# Altium schematic symbol library jlcpcb_2025_04_capacitors_extended_0402.schlib: 3594 symbols (part 9 of 20)
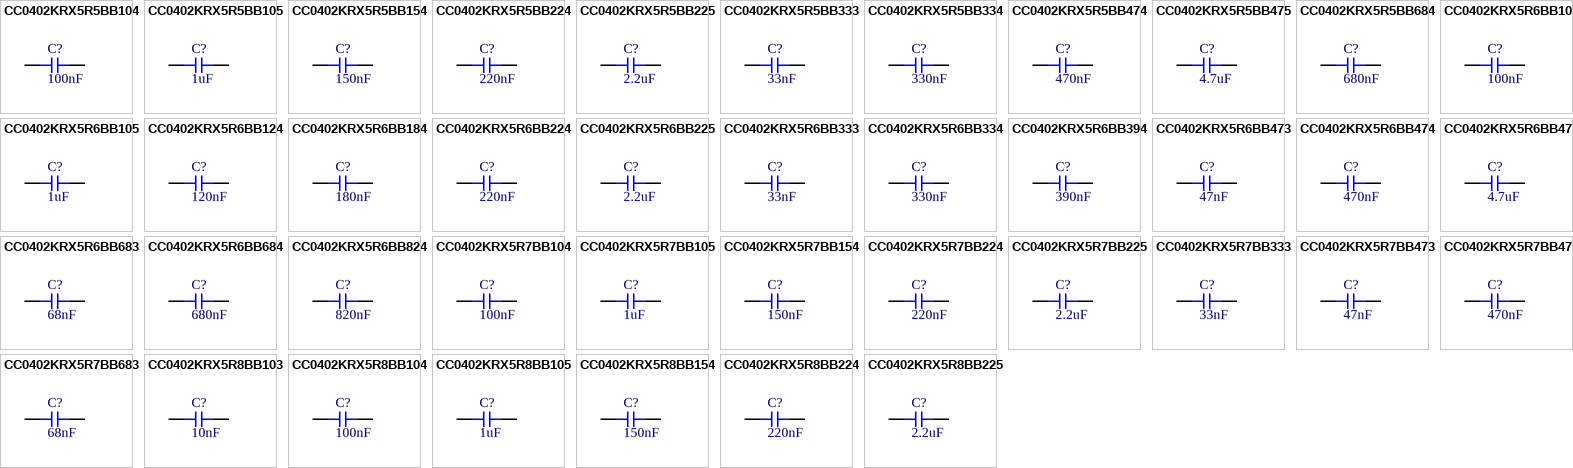
[diagram p97: symbols CC0402KRX5R5BB104 to CC0402KRX5R8BB225]

## CC0402KRX5R6BB105
designator C?  Capacitance: 1uF  (hidden comment: *)
Capacitor, Ceramic (MLCC), 1uF, ±10%, 10V, X5R, ±10%, SMD 0402; Manufacturer: YAGEO; Manufacturer Part Number: CC0402KRX5R6BB105; Package Size: 0402; JLCPCB Basic Part: No; JLCPCB Part Number: C106254; Supplier 1: LCSC; Category: Capacitors - MLCC; Supplier Part Number 1: C106254; Tolerance: ±10%; Voltage Rating: 10V; Temperature Coefficient: X5R; RoHS: Yes; ComponentLink1Description: Datasheet; ComponentLink1URL: https://wmsc.lcsc.com/wmsc/upload/file/pdf/v2/lcsc/2407081117_YAGEO-CC0402KRX5R6BB105_C106254.pdf; ComponentLink2Description: JLCPCB Part URL; ComponentLink2URL: https://jlcpcb.com/partdetail/C106254; ComponentLink3Description: LCSC Part URL; ComponentLink3URL: https://lcsc.com/product-detail/Multilayer-Ceramic-Capacitors-MLCC---SMD-SMT_YAGEO-YAGEO-CC0402KRX5R6BB105_C106254.html
footprint CAP-0402 (0402 (1005M) Capacitor)
pins: 1, 2

## CC0402KRX5R6BB124
designator C?  Capacitance: 120nF  (hidden comment: *)
Capacitor, Ceramic (MLCC), 120nF, ±10%, 10V, X5R, ±10%, SMD 0402; Manufacturer: YAGEO; Manufacturer Part Number: CC0402KRX5R6BB124; Package Size: 0402; JLCPCB Basic Part: No; JLCPCB Part Number: C576722; Supplier 1: LCSC; Category: Capacitors - MLCC; Supplier Part Number 1: C576722; Tolerance: ±10%; Voltage Rating: 10V; Temperature Coefficient: X5R; RoHS: Yes; ComponentLink1Description: Datasheet; ComponentLink1URL: https://wmsc.lcsc.com/wmsc/upload/file/pdf/v2/lcsc/2407081117_YAGEO-CC0402KRX5R6BB124_C576722.pdf; ComponentLink2Description: JLCPCB Part URL; ComponentLink2URL: https://jlcpcb.com/partdetail/C576722; ComponentLink3Description: LCSC Part URL; ComponentLink3URL: https://lcsc.com/product-detail/Multilayer-Ceramic-Capacitors-MLCC---SMD-SMT_YAGEO-YAGEO-CC0402KRX5R6BB124_C576722.html
footprint CAP-0402 (0402 (1005M) Capacitor)
pins: 1, 2

## CC0402KRX5R6BB184
designator C?  Capacitance: 180nF  (hidden comment: *)
Capacitor, Ceramic (MLCC), 180nF, ±10%, 10V, X5R, ±10%, SMD 0402; Manufacturer: YAGEO; Manufacturer Part Number: CC0402KRX5R6BB184; Package Size: 0402; JLCPCB Basic Part: No; JLCPCB Part Number: C309457; Supplier 1: LCSC; Category: Capacitors - MLCC; Supplier Part Number 1: C309457; Tolerance: ±10%; Voltage Rating: 10V; Temperature Coefficient: X5R; RoHS: Yes; ComponentLink1Description: Datasheet; ComponentLink1URL: https://wmsc.lcsc.com/wmsc/upload/file/pdf/v2/lcsc/2407081117_YAGEO-CC0402KRX5R6BB184_C309457.pdf; ComponentLink2Description: JLCPCB Part URL; ComponentLink2URL: https://jlcpcb.com/partdetail/C309457; ComponentLink3Description: LCSC Part URL; ComponentLink3URL: https://lcsc.com/product-detail/Multilayer-Ceramic-Capacitors-MLCC---SMD-SMT_YAGEO-YAGEO-CC0402KRX5R6BB184_C309457.html
footprint CAP-0402 (0402 (1005M) Capacitor)
pins: 1, 2

## CC0402KRX5R6BB224
designator C?  Capacitance: 220nF  (hidden comment: *)
Capacitor, Ceramic (MLCC), 220nF, ±10%, 10V, X5R, ±10%, SMD 0402; Manufacturer: YAGEO; Manufacturer Part Number: CC0402KRX5R6BB224; Package Size: 0402; JLCPCB Basic Part: No; JLCPCB Part Number: C106257; Supplier 1: LCSC; Category: Capacitors - MLCC; Supplier Part Number 1: C106257; Tolerance: ±10%; Voltage Rating: 10V; Temperature Coefficient: X5R; RoHS: Yes; ComponentLink1Description: Datasheet; ComponentLink1URL: https://wmsc.lcsc.com/wmsc/upload/file/pdf/v2/lcsc/2407081117_YAGEO-CC0402KRX5R6BB224_C106257.pdf; ComponentLink2Description: JLCPCB Part URL; ComponentLink2URL: https://jlcpcb.com/partdetail/C106257; ComponentLink3Description: LCSC Part URL; ComponentLink3URL: https://lcsc.com/product-detail/Multilayer-Ceramic-Capacitors-MLCC---SMD-SMT_YAGEO-YAGEO-CC0402KRX5R6BB224_C106257.html
footprint CAP-0402 (0402 (1005M) Capacitor)
pins: 1, 2

## CC0402KRX5R6BB225
designator C?  Capacitance: 2.2uF  (hidden comment: *)
Capacitor, Ceramic (MLCC), 2.2uF, ±10%, 10V, X5R, ±10%, SMD 0402; Manufacturer: YAGEO; Manufacturer Part Number: CC0402KRX5R6BB225; Package Size: 0402; JLCPCB Basic Part: No; JLCPCB Part Number: C326606; Supplier 1: LCSC; Category: Capacitors - MLCC; Supplier Part Number 1: C326606; Tolerance: ±10%; Voltage Rating: 10V; Temperature Coefficient: X5R; RoHS: Yes; ComponentLink1Description: Datasheet; ComponentLink1URL: https://wmsc.lcsc.com/wmsc/upload/file/pdf/v2/lcsc/2407081117_YAGEO-CC0402KRX5R6BB225_C326606.pdf; ComponentLink2Description: JLCPCB Part URL; ComponentLink2URL: https://jlcpcb.com/partdetail/C326606; ComponentLink3Description: LCSC Part URL; ComponentLink3URL: https://lcsc.com/product-detail/Multilayer-Ceramic-Capacitors-MLCC---SMD-SMT_YAGEO-YAGEO-CC0402KRX5R6BB225_C326606.html
footprint CAP-0402 (0402 (1005M) Capacitor)
pins: 1, 2

## CC0402KRX5R6BB333
designator C?  Capacitance: 33nF  (hidden comment: *)
Capacitor, Ceramic (MLCC), 33nF, ±10%, 10V, X5R, ±10%, SMD 0402; Manufacturer: YAGEO; Manufacturer Part Number: CC0402KRX5R6BB333; Package Size: 0402; JLCPCB Basic Part: No; JLCPCB Part Number: C541396; Supplier 1: LCSC; Category: Capacitors - MLCC; Supplier Part Number 1: C541396; Tolerance: ±10%; Voltage Rating: 10V; Temperature Coefficient: X5R; RoHS: Yes; ComponentLink1Description: Datasheet; ComponentLink1URL: https://wmsc.lcsc.com/wmsc/upload/file/pdf/v2/lcsc/2407081117_YAGEO-CC0402KRX5R6BB333_C541396.pdf; ComponentLink2Description: JLCPCB Part URL; ComponentLink2URL: https://jlcpcb.com/partdetail/C541396; ComponentLink3Description: LCSC Part URL; ComponentLink3URL: https://lcsc.com/product-detail/Multilayer-Ceramic-Capacitors-MLCC---SMD-SMT_YAGEO-YAGEO-CC0402KRX5R6BB333_C541396.html
footprint CAP-0402 (0402 (1005M) Capacitor)
pins: 1, 2

## CC0402KRX5R6BB334
designator C?  Capacitance: 330nF  (hidden comment: *)
Capacitor, Ceramic (MLCC), 330nF, ±10%, 10V, X5R, ±10%, SMD 0402; Manufacturer: YAGEO; Manufacturer Part Number: CC0402KRX5R6BB334; Package Size: 0402; JLCPCB Basic Part: No; JLCPCB Part Number: C107013; Supplier 1: LCSC; Category: Capacitors - MLCC; Supplier Part Number 1: C107013; Tolerance: ±10%; Voltage Rating: 10V; Temperature Coefficient: X5R; RoHS: Yes; ComponentLink1Description: Datasheet; ComponentLink1URL: https://wmsc.lcsc.com/wmsc/upload/file/pdf/v2/lcsc/2407081117_YAGEO-CC0402KRX5R6BB334_C107013.pdf; ComponentLink2Description: JLCPCB Part URL; ComponentLink2URL: https://jlcpcb.com/partdetail/C107013; ComponentLink3Description: LCSC Part URL; ComponentLink3URL: https://lcsc.com/product-detail/Multilayer-Ceramic-Capacitors-MLCC---SMD-SMT_YAGEO-YAGEO-CC0402KRX5R6BB334_C107013.html
footprint CAP-0402 (0402 (1005M) Capacitor)
pins: 1, 2

## CC0402KRX5R6BB394
designator C?  Capacitance: 390nF  (hidden comment: *)
Capacitor, Ceramic (MLCC), 390nF, ±10%, 10V, X5R, ±10%, SMD 0402; Manufacturer: YAGEO; Manufacturer Part Number: CC0402KRX5R6BB394; Package Size: 0402; JLCPCB Basic Part: No; JLCPCB Part Number: C7500384; Supplier 1: LCSC; Category: Capacitors - MLCC; Supplier Part Number 1: C7500384; Tolerance: ±10%; Voltage Rating: 10V; Temperature Coefficient: X5R; RoHS: Yes; ComponentLink1Description: Datasheet; ComponentLink1URL: https://wmsc.lcsc.com/wmsc/upload/file/pdf/v2/lcsc/2407081117_YAGEO-CC0402KRX5R6BB394_C7500384.pdf; ComponentLink2Description: JLCPCB Part URL; ComponentLink2URL: https://jlcpcb.com/partdetail/C7500384; ComponentLink3Description: LCSC Part URL; ComponentLink3URL: https://lcsc.com/product-detail/Multilayer-Ceramic-Capacitors-MLCC---SMD-SMT_YAGEO-YAGEO-CC0402KRX5R6BB394_C7500384.html
footprint CAP-0402 (0402 (1005M) Capacitor)
pins: 1, 2

## CC0402KRX5R6BB473
designator C?  Capacitance: 47nF  (hidden comment: *)
Capacitor, Ceramic (MLCC), 47nF, ±10%, 10V, X5R, ±10%, SMD 0402; Manufacturer: YAGEO; Manufacturer Part Number: CC0402KRX5R6BB473; Package Size: 0402; JLCPCB Basic Part: No; JLCPCB Part Number: C541397; Supplier 1: LCSC; Category: Capacitors - MLCC; Supplier Part Number 1: C541397; Tolerance: ±10%; Voltage Rating: 10V; Temperature Coefficient: X5R; RoHS: Yes; ComponentLink1Description: Datasheet; ComponentLink1URL: https://wmsc.lcsc.com/wmsc/upload/file/pdf/v2/lcsc/2407081117_YAGEO-CC0402KRX5R6BB473_C541397.pdf; ComponentLink2Description: JLCPCB Part URL; ComponentLink2URL: https://jlcpcb.com/partdetail/C541397; ComponentLink3Description: LCSC Part URL; ComponentLink3URL: https://lcsc.com/product-detail/Multilayer-Ceramic-Capacitors-MLCC---SMD-SMT_YAGEO-YAGEO-CC0402KRX5R6BB473_C541397.html
footprint CAP-0402 (0402 (1005M) Capacitor)
pins: 1, 2

## CC0402KRX5R6BB474
designator C?  Capacitance: 470nF  (hidden comment: *)
Capacitor, Ceramic (MLCC), 470nF, ±10%, 10V, X5R, ±10%, SMD 0402; Manufacturer: YAGEO; Manufacturer Part Number: CC0402KRX5R6BB474; Package Size: 0402; JLCPCB Basic Part: No; JLCPCB Part Number: C106255; Supplier 1: LCSC; Category: Capacitors - MLCC; Supplier Part Number 1: C106255; Tolerance: ±10%; Voltage Rating: 10V; Temperature Coefficient: X5R; RoHS: Yes; ComponentLink1Description: Datasheet; ComponentLink1URL: https://wmsc.lcsc.com/wmsc/upload/file/pdf/v2/lcsc/2407081117_YAGEO-CC0402KRX5R6BB474_C106255.pdf; ComponentLink2Description: JLCPCB Part URL; ComponentLink2URL: https://jlcpcb.com/partdetail/C106255; ComponentLink3Description: LCSC Part URL; ComponentLink3URL: https://lcsc.com/product-detail/Multilayer-Ceramic-Capacitors-MLCC---SMD-SMT_YAGEO-YAGEO-CC0402KRX5R6BB474_C106255.html
footprint CAP-0402 (0402 (1005M) Capacitor)
pins: 1, 2

## CC0402KRX5R6BB475
designator C?  Capacitance: 4.7uF  (hidden comment: *)
Capacitor, Ceramic (MLCC), 4.7uF, ±10%, 10V, X5R, ±10%, SMD 0402; Manufacturer: YAGEO; Manufacturer Part Number: CC0402KRX5R6BB475; Package Size: 0402; JLCPCB Basic Part: No; JLCPCB Part Number: C326586; Supplier 1: LCSC; Category: Capacitors - MLCC; Supplier Part Number 1: C326586; Tolerance: ±10%; Voltage Rating: 10V; Temperature Coefficient: X5R; RoHS: Yes; ComponentLink1Description: Datasheet; ComponentLink1URL: https://wmsc.lcsc.com/wmsc/upload/file/pdf/v2/lcsc/2407081117_YAGEO-CC0402KRX5R6BB475_C326586.pdf; ComponentLink2Description: JLCPCB Part URL; ComponentLink2URL: https://jlcpcb.com/partdetail/C326586; ComponentLink3Description: LCSC Part URL; ComponentLink3URL: https://lcsc.com/product-detail/Multilayer-Ceramic-Capacitors-MLCC---SMD-SMT_YAGEO-YAGEO-CC0402KRX5R6BB475_C326586.html
footprint CAP-0402 (0402 (1005M) Capacitor)
pins: 1, 2

## CC0402KRX5R6BB683
designator C?  Capacitance: 68nF  (hidden comment: *)
Capacitor, Ceramic (MLCC), 68nF, ±10%, 10V, X5R, ±10%, SMD 0402; Manufacturer: YAGEO; Manufacturer Part Number: CC0402KRX5R6BB683; Package Size: 0402; JLCPCB Basic Part: No; JLCPCB Part Number: C541398; Supplier 1: LCSC; Category: Capacitors - MLCC; Supplier Part Number 1: C541398; Tolerance: ±10%; Voltage Rating: 10V; Temperature Coefficient: X5R; RoHS: Yes; ComponentLink1Description: Datasheet; ComponentLink1URL: https://wmsc.lcsc.com/wmsc/upload/file/pdf/v2/lcsc/2407081117_YAGEO-CC0402KRX5R6BB683_C541398.pdf; ComponentLink2Description: JLCPCB Part URL; ComponentLink2URL: https://jlcpcb.com/partdetail/C541398; ComponentLink3Description: LCSC Part URL; ComponentLink3URL: https://lcsc.com/product-detail/Multilayer-Ceramic-Capacitors-MLCC---SMD-SMT_YAGEO-YAGEO-CC0402KRX5R6BB683_C541398.html
footprint CAP-0402 (0402 (1005M) Capacitor)
pins: 1, 2

## CC0402KRX5R6BB684
designator C?  Capacitance: 680nF  (hidden comment: *)
Capacitor, Ceramic (MLCC), 680nF, ±10%, 10V, X5R, ±10%, SMD 0402; Manufacturer: YAGEO; Manufacturer Part Number: CC0402KRX5R6BB684; Package Size: 0402; JLCPCB Basic Part: No; JLCPCB Part Number: C113784; Supplier 1: LCSC; Category: Capacitors - MLCC; Supplier Part Number 1: C113784; Tolerance: ±10%; Voltage Rating: 10V; Temperature Coefficient: X5R; RoHS: Yes; ComponentLink1Description: Datasheet; ComponentLink1URL: https://wmsc.lcsc.com/wmsc/upload/file/pdf/v2/lcsc/2407081117_YAGEO-CC0402KRX5R6BB684_C113784.pdf; ComponentLink2Description: JLCPCB Part URL; ComponentLink2URL: https://jlcpcb.com/partdetail/C113784; ComponentLink3Description: LCSC Part URL; ComponentLink3URL: https://lcsc.com/product-detail/Multilayer-Ceramic-Capacitors-MLCC---SMD-SMT_YAGEO-YAGEO-CC0402KRX5R6BB684_C113784.html
footprint CAP-0402 (0402 (1005M) Capacitor)
pins: 1, 2

## CC0402KRX5R6BB824
designator C?  Capacitance: 820nF  (hidden comment: *)
Capacitor, Ceramic (MLCC), 820nF, ±10%, 10V, X5R, ±10%, SMD 0402; Manufacturer: YAGEO; Manufacturer Part Number: CC0402KRX5R6BB824; Package Size: 0402; JLCPCB Basic Part: No; JLCPCB Part Number: C576724; Supplier 1: LCSC; Category: Capacitors - MLCC; Supplier Part Number 1: C576724; Tolerance: ±10%; Voltage Rating: 10V; Temperature Coefficient: X5R; RoHS: Yes; ComponentLink1Description: Datasheet; ComponentLink1URL: https://wmsc.lcsc.com/wmsc/upload/file/pdf/v2/lcsc/2407081117_YAGEO-CC0402KRX5R6BB824_C576724.pdf; ComponentLink2Description: JLCPCB Part URL; ComponentLink2URL: https://jlcpcb.com/partdetail/C576724; ComponentLink3Description: LCSC Part URL; ComponentLink3URL: https://lcsc.com/product-detail/Multilayer-Ceramic-Capacitors-MLCC---SMD-SMT_YAGEO-YAGEO-CC0402KRX5R6BB824_C576724.html
footprint CAP-0402 (0402 (1005M) Capacitor)
pins: 1, 2

## CC0402KRX5R7BB104
designator C?  Capacitance: 100nF  (hidden comment: *)
Capacitor, Ceramic (MLCC), 100nF, ±10%, 16V, X5R, ±10%, SMD 0402; Manufacturer: YAGEO; Manufacturer Part Number: CC0402KRX5R7BB104; Package Size: 0402; JLCPCB Basic Part: No; JLCPCB Part Number: C106204; Supplier 1: LCSC; Category: Capacitors - MLCC; Supplier Part Number 1: C106204; Tolerance: ±10%; Voltage Rating: 16V; Temperature Coefficient: X5R; RoHS: Yes; ComponentLink1Description: Datasheet; ComponentLink1URL: https://wmsc.lcsc.com/wmsc/upload/file/pdf/v2/lcsc/2407081117_YAGEO-CC0402KRX5R7BB104_C106204.pdf; ComponentLink2Description: JLCPCB Part URL; ComponentLink2URL: https://jlcpcb.com/partdetail/C106204; ComponentLink3Description: LCSC Part URL; ComponentLink3URL: https://lcsc.com/product-detail/Multilayer-Ceramic-Capacitors-MLCC---SMD-SMT_YAGEO-YAGEO-CC0402KRX5R7BB104_C106204.html
footprint CAP-0402 (0402 (1005M) Capacitor)
pins: 1, 2

## CC0402KRX5R7BB105
designator C?  Capacitance: 1uF  (hidden comment: *)
Capacitor, Ceramic (MLCC), 1uF, ±10%, 16V, X5R, ±10%, SMD 0402; Manufacturer: YAGEO; Manufacturer Part Number: CC0402KRX5R7BB105; Package Size: 0402; JLCPCB Basic Part: No; JLCPCB Part Number: C325464; Supplier 1: LCSC; Category: Capacitors - MLCC; Supplier Part Number 1: C325464; Tolerance: ±10%; Voltage Rating: 16V; Temperature Coefficient: X5R; RoHS: Yes; ComponentLink1Description: Datasheet; ComponentLink1URL: https://wmsc.lcsc.com/wmsc/upload/file/pdf/v2/lcsc/2407081117_YAGEO-CC0402KRX5R7BB105_C325464.pdf; ComponentLink2Description: JLCPCB Part URL; ComponentLink2URL: https://jlcpcb.com/partdetail/C325464; ComponentLink3Description: LCSC Part URL; ComponentLink3URL: https://lcsc.com/product-detail/Multilayer-Ceramic-Capacitors-MLCC---SMD-SMT_YAGEO-YAGEO-CC0402KRX5R7BB105_C325464.html
footprint CAP-0402 (0402 (1005M) Capacitor)
pins: 1, 2

## CC0402KRX5R7BB154
designator C?  Capacitance: 150nF  (hidden comment: *)
Capacitor, Ceramic (MLCC), 150nF, ±10%, 16V, X5R, ±10%, SMD 0402; Manufacturer: YAGEO; Manufacturer Part Number: CC0402KRX5R7BB154; Package Size: 0402; JLCPCB Basic Part: No; JLCPCB Part Number: C576725; Supplier 1: LCSC; Category: Capacitors - MLCC; Supplier Part Number 1: C576725; Tolerance: ±10%; Voltage Rating: 16V; Temperature Coefficient: X5R; RoHS: Yes; ComponentLink1Description: Datasheet; ComponentLink1URL: https://wmsc.lcsc.com/wmsc/upload/file/pdf/v2/lcsc/2407081117_YAGEO-CC0402KRX5R7BB154_C576725.pdf; ComponentLink2Description: JLCPCB Part URL; ComponentLink2URL: https://jlcpcb.com/partdetail/C576725; ComponentLink3Description: LCSC Part URL; ComponentLink3URL: https://lcsc.com/product-detail/Multilayer-Ceramic-Capacitors-MLCC---SMD-SMT_YAGEO-YAGEO-CC0402KRX5R7BB154_C576725.html
footprint CAP-0402 (0402 (1005M) Capacitor)
pins: 1, 2

## CC0402KRX5R7BB224
designator C?  Capacitance: 220nF  (hidden comment: *)
Capacitor, Ceramic (MLCC), 220nF, ±10%, 16V, X5R, ±10%, SMD 0402; Manufacturer: YAGEO; Manufacturer Part Number: CC0402KRX5R7BB224; Package Size: 0402; JLCPCB Basic Part: No; JLCPCB Part Number: C106258; Supplier 1: LCSC; Category: Capacitors - MLCC; Supplier Part Number 1: C106258; Tolerance: ±10%; Voltage Rating: 16V; Temperature Coefficient: X5R; RoHS: Yes; ComponentLink1Description: Datasheet; ComponentLink1URL: https://wmsc.lcsc.com/wmsc/upload/file/pdf/v2/lcsc/2407081117_YAGEO-CC0402KRX5R7BB224_C106258.pdf; ComponentLink2Description: JLCPCB Part URL; ComponentLink2URL: https://jlcpcb.com/partdetail/C106258; ComponentLink3Description: LCSC Part URL; ComponentLink3URL: https://lcsc.com/product-detail/Multilayer-Ceramic-Capacitors-MLCC---SMD-SMT_YAGEO-YAGEO-CC0402KRX5R7BB224_C106258.html
footprint CAP-0402 (0402 (1005M) Capacitor)
pins: 1, 2

## CC0402KRX5R7BB225
designator C?  Capacitance: 2.2uF  (hidden comment: *)
Capacitor, Ceramic (MLCC), 2.2uF, ±10%, 16V, X5R, ±10%, SMD 0402; Manufacturer: YAGEO; Manufacturer Part Number: CC0402KRX5R7BB225; Package Size: 0402; JLCPCB Basic Part: No; JLCPCB Part Number: C326556; Supplier 1: LCSC; Category: Capacitors - MLCC; Supplier Part Number 1: C326556; Tolerance: ±10%; Voltage Rating: 16V; Temperature Coefficient: X5R; RoHS: Yes; ComponentLink1Description: Datasheet; ComponentLink1URL: https://wmsc.lcsc.com/wmsc/upload/file/pdf/v2/lcsc/2407081039_YAGEO-CC0402KRX5R7BB225_C326556.pdf; ComponentLink2Description: JLCPCB Part URL; ComponentLink2URL: https://jlcpcb.com/partdetail/C326556; ComponentLink3Description: LCSC Part URL; ComponentLink3URL: https://lcsc.com/product-detail/Multilayer-Ceramic-Capacitors-MLCC---SMD-SMT_YAGEO-YAGEO-CC0402KRX5R7BB225_C326556.html
footprint CAP-0402 (0402 (1005M) Capacitor)
pins: 1, 2

## CC0402KRX5R7BB333
designator C?  Capacitance: 33nF  (hidden comment: *)
Capacitor, Ceramic (MLCC), 33nF, ±10%, 16V, X5R, ±10%, SMD 0402; Manufacturer: YAGEO; Manufacturer Part Number: CC0402KRX5R7BB333; Package Size: 0402; JLCPCB Basic Part: No; JLCPCB Part Number: C505503; Supplier 1: LCSC; Category: Capacitors - MLCC; Supplier Part Number 1: C505503; Tolerance: ±10%; Voltage Rating: 16V; Temperature Coefficient: X5R; RoHS: Yes; ComponentLink1Description: Datasheet; ComponentLink1URL: https://wmsc.lcsc.com/wmsc/upload/file/pdf/v2/lcsc/2407081117_YAGEO-CC0402KRX5R7BB333_C505503.pdf; ComponentLink2Description: JLCPCB Part URL; ComponentLink2URL: https://jlcpcb.com/partdetail/C505503; ComponentLink3Description: LCSC Part URL; ComponentLink3URL: https://lcsc.com/product-detail/Multilayer-Ceramic-Capacitors-MLCC---SMD-SMT_YAGEO-YAGEO-CC0402KRX5R7BB333_C505503.html
footprint CAP-0402 (0402 (1005M) Capacitor)
pins: 1, 2

## CC0402KRX5R7BB473
designator C?  Capacitance: 47nF  (hidden comment: *)
Capacitor, Ceramic (MLCC), 47nF, ±10%, 16V, X5R, ±10%, SMD 0402; Manufacturer: YAGEO; Manufacturer Part Number: CC0402KRX5R7BB473; Package Size: 0402; JLCPCB Basic Part: No; JLCPCB Part Number: C505498; Supplier 1: LCSC; Category: Capacitors - MLCC; Supplier Part Number 1: C505498; Tolerance: ±10%; Voltage Rating: 16V; Temperature Coefficient: X5R; RoHS: Yes; ComponentLink1Description: Datasheet; ComponentLink1URL: https://wmsc.lcsc.com/wmsc/upload/file/pdf/v2/lcsc/2407081117_YAGEO-CC0402KRX5R7BB473_C505498.pdf; ComponentLink2Description: JLCPCB Part URL; ComponentLink2URL: https://jlcpcb.com/partdetail/C505498; ComponentLink3Description: LCSC Part URL; ComponentLink3URL: https://lcsc.com/product-detail/Multilayer-Ceramic-Capacitors-MLCC---SMD-SMT_YAGEO-YAGEO-CC0402KRX5R7BB473_C505498.html
footprint CAP-0402 (0402 (1005M) Capacitor)
pins: 1, 2

## CC0402KRX5R7BB474
designator C?  Capacitance: 470nF  (hidden comment: *)
Capacitor, Ceramic (MLCC), 470nF, ±10%, 16V, X5R, ±10%, SMD 0402; Manufacturer: YAGEO; Manufacturer Part Number: CC0402KRX5R7BB474; Package Size: 0402; JLCPCB Basic Part: No; JLCPCB Part Number: C527010; Supplier 1: LCSC; Category: Capacitors - MLCC; Supplier Part Number 1: C527010; Tolerance: ±10%; Voltage Rating: 16V; Temperature Coefficient: X5R; RoHS: Yes; ComponentLink1Description: Datasheet; ComponentLink1URL: https://wmsc.lcsc.com/wmsc/upload/file/pdf/v2/lcsc/2407081117_YAGEO-CC0402KRX5R7BB474_C527010.pdf; ComponentLink2Description: JLCPCB Part URL; ComponentLink2URL: https://jlcpcb.com/partdetail/C527010; ComponentLink3Description: LCSC Part URL; ComponentLink3URL: https://lcsc.com/product-detail/Multilayer-Ceramic-Capacitors-MLCC---SMD-SMT_YAGEO-YAGEO-CC0402KRX5R7BB474_C527010.html
footprint CAP-0402 (0402 (1005M) Capacitor)
pins: 1, 2

## CC0402KRX5R7BB683
designator C?  Capacitance: 68nF  (hidden comment: *)
Capacitor, Ceramic (MLCC), 68nF, ±10%, 16V, X5R, ±10%, SMD 0402; Manufacturer: YAGEO; Manufacturer Part Number: CC0402KRX5R7BB683; Package Size: 0402; JLCPCB Basic Part: No; JLCPCB Part Number: C527011; Supplier 1: LCSC; Category: Capacitors - MLCC; Supplier Part Number 1: C527011; Tolerance: ±10%; Voltage Rating: 16V; Temperature Coefficient: X5R; RoHS: Yes; ComponentLink1Description: Datasheet; ComponentLink1URL: https://wmsc.lcsc.com/wmsc/upload/file/pdf/v2/lcsc/2407081117_YAGEO-CC0402KRX5R7BB683_C527011.pdf; ComponentLink2Description: JLCPCB Part URL; ComponentLink2URL: https://jlcpcb.com/partdetail/C527011; ComponentLink3Description: LCSC Part URL; ComponentLink3URL: https://lcsc.com/product-detail/Multilayer-Ceramic-Capacitors-MLCC---SMD-SMT_YAGEO-YAGEO-CC0402KRX5R7BB683_C527011.html
footprint CAP-0402 (0402 (1005M) Capacitor)
pins: 1, 2

## CC0402KRX5R8BB103
designator C?  Capacitance: 10nF  (hidden comment: *)
Capacitor, Ceramic (MLCC), 10nF, ±10%, 25V, X5R, ±10%, SMD 0402; Manufacturer: YAGEO; Manufacturer Part Number: CC0402KRX5R8BB103; Package Size: 0402; JLCPCB Basic Part: No; JLCPCB Part Number: C576726; Supplier 1: LCSC; Category: Capacitors - MLCC; Supplier Part Number 1: C576726; Tolerance: ±10%; Voltage Rating: 25V; Temperature Coefficient: X5R; RoHS: Yes; ComponentLink1Description: Datasheet; ComponentLink1URL: https://wmsc.lcsc.com/wmsc/upload/file/pdf/v2/lcsc/2407081117_YAGEO-CC0402KRX5R8BB103_C576726.pdf; ComponentLink2Description: JLCPCB Part URL; ComponentLink2URL: https://jlcpcb.com/partdetail/C576726; ComponentLink3Description: LCSC Part URL; ComponentLink3URL: https://lcsc.com/product-detail/Multilayer-Ceramic-Capacitors-MLCC---SMD-SMT_YAGEO-YAGEO-CC0402KRX5R8BB103_C576726.html
footprint CAP-0402 (0402 (1005M) Capacitor)
pins: 1, 2

## CC0402KRX5R8BB104
designator C?  Capacitance: 100nF  (hidden comment: *)
Capacitor, Ceramic (MLCC), 100nF, ±10%, 25V, X5R, ±10%, SMD 0402; Manufacturer: YAGEO; Manufacturer Part Number: CC0402KRX5R8BB104; Package Size: 0402; JLCPCB Basic Part: No; JLCPCB Part Number: C106256; Supplier 1: LCSC; Category: Capacitors - MLCC; Supplier Part Number 1: C106256; Tolerance: ±10%; Voltage Rating: 25V; Temperature Coefficient: X5R; RoHS: Yes; ComponentLink1Description: Datasheet; ComponentLink1URL: https://wmsc.lcsc.com/wmsc/upload/file/pdf/v2/lcsc/2407081117_YAGEO-CC0402KRX5R8BB104_C106256.pdf; ComponentLink2Description: JLCPCB Part URL; ComponentLink2URL: https://jlcpcb.com/partdetail/C106256; ComponentLink3Description: LCSC Part URL; ComponentLink3URL: https://lcsc.com/product-detail/Multilayer-Ceramic-Capacitors-MLCC---SMD-SMT_YAGEO-YAGEO-CC0402KRX5R8BB104_C106256.html
footprint CAP-0402 (0402 (1005M) Capacitor)
pins: 1, 2

## CC0402KRX5R8BB105
designator C?  Capacitance: 1uF  (hidden comment: *)
Capacitor, Ceramic (MLCC), 1uF, ±10%, 25V, X5R, ±10%, SMD 0402; Manufacturer: YAGEO; Manufacturer Part Number: CC0402KRX5R8BB105; Package Size: 0402; JLCPCB Basic Part: No; JLCPCB Part Number: C326568; Supplier 1: LCSC; Category: Capacitors - MLCC; Supplier Part Number 1: C326568; Tolerance: ±10%; Voltage Rating: 25V; Temperature Coefficient: X5R; RoHS: Yes; ComponentLink1Description: Datasheet; ComponentLink1URL: https://wmsc.lcsc.com/wmsc/upload/file/pdf/v2/lcsc/2407081117_YAGEO-CC0402KRX5R8BB105_C326568.pdf; ComponentLink2Description: JLCPCB Part URL; ComponentLink2URL: https://jlcpcb.com/partdetail/C326568; ComponentLink3Description: LCSC Part URL; ComponentLink3URL: https://lcsc.com/product-detail/Multilayer-Ceramic-Capacitors-MLCC---SMD-SMT_YAGEO-YAGEO-CC0402KRX5R8BB105_C326568.html
footprint CAP-0402 (0402 (1005M) Capacitor)
pins: 1, 2

## CC0402KRX5R8BB154
designator C?  Capacitance: 150nF  (hidden comment: *)
Capacitor, Ceramic (MLCC), 150nF, ±10%, 25V, X5R, ±10%, SMD 0402; Manufacturer: YAGEO; Manufacturer Part Number: CC0402KRX5R8BB154; Package Size: 0402; JLCPCB Basic Part: No; JLCPCB Part Number: C576727; Supplier 1: LCSC; Category: Capacitors - MLCC; Supplier Part Number 1: C576727; Tolerance: ±10%; Voltage Rating: 25V; Temperature Coefficient: X5R; RoHS: Yes; ComponentLink1Description: Datasheet; ComponentLink1URL: https://wmsc.lcsc.com/wmsc/upload/file/pdf/v2/lcsc/2407081117_YAGEO-CC0402KRX5R8BB154_C576727.pdf; ComponentLink2Description: JLCPCB Part URL; ComponentLink2URL: https://jlcpcb.com/partdetail/C576727; ComponentLink3Description: LCSC Part URL; ComponentLink3URL: https://lcsc.com/product-detail/Multilayer-Ceramic-Capacitors-MLCC---SMD-SMT_YAGEO-YAGEO-CC0402KRX5R8BB154_C576727.html
footprint CAP-0402 (0402 (1005M) Capacitor)
pins: 1, 2

## CC0402KRX5R8BB224
designator C?  Capacitance: 220nF  (hidden comment: *)
Capacitor, Ceramic (MLCC), 220nF, ±10%, 25V, X5R, ±10%, SMD 0402; Manufacturer: YAGEO; Manufacturer Part Number: CC0402KRX5R8BB224; Package Size: 0402; JLCPCB Basic Part: No; JLCPCB Part Number: C326836; Supplier 1: LCSC; Category: Capacitors - MLCC; Supplier Part Number 1: C326836; Tolerance: ±10%; Voltage Rating: 25V; Temperature Coefficient: X5R; RoHS: Yes; ComponentLink1Description: Datasheet; ComponentLink1URL: https://wmsc.lcsc.com/wmsc/upload/file/pdf/v2/lcsc/2407081117_YAGEO-CC0402KRX5R8BB224_C326836.pdf; ComponentLink2Description: JLCPCB Part URL; ComponentLink2URL: https://jlcpcb.com/partdetail/C326836; ComponentLink3Description: LCSC Part URL; ComponentLink3URL: https://lcsc.com/product-detail/Multilayer-Ceramic-Capacitors-MLCC---SMD-SMT_YAGEO-YAGEO-CC0402KRX5R8BB224_C326836.html
footprint CAP-0402 (0402 (1005M) Capacitor)
pins: 1, 2

## CC0402KRX5R8BB225
designator C?  Capacitance: 2.2uF  (hidden comment: *)
Capacitor, Ceramic (MLCC), 2.2uF, ±10%, 25V, X5R, ±10%, SMD 0402; Manufacturer: YAGEO; Manufacturer Part Number: CC0402KRX5R8BB225; Package Size: 0402; JLCPCB Basic Part: No; JLCPCB Part Number: C723363; Supplier 1: LCSC; Category: Capacitors - MLCC; Supplier Part Number 1: C723363; Tolerance: ±10%; Voltage Rating: 25V; Temperature Coefficient: X5R; RoHS: Yes; ComponentLink1Description: Datasheet; ComponentLink1URL: https://wmsc.lcsc.com/wmsc/upload/file/pdf/v2/lcsc/2407081117_YAGEO-CC0402KRX5R8BB225_C723363.pdf; ComponentLink2Description: JLCPCB Part URL; ComponentLink2URL: https://jlcpcb.com/partdetail/C723363; ComponentLink3Description: LCSC Part URL; ComponentLink3URL: https://lcsc.com/product-detail/Multilayer-Ceramic-Capacitors-MLCC---SMD-SMT_YAGEO-YAGEO-CC0402KRX5R8BB225_C723363.html
footprint CAP-0402 (0402 (1005M) Capacitor)
pins: 1, 2

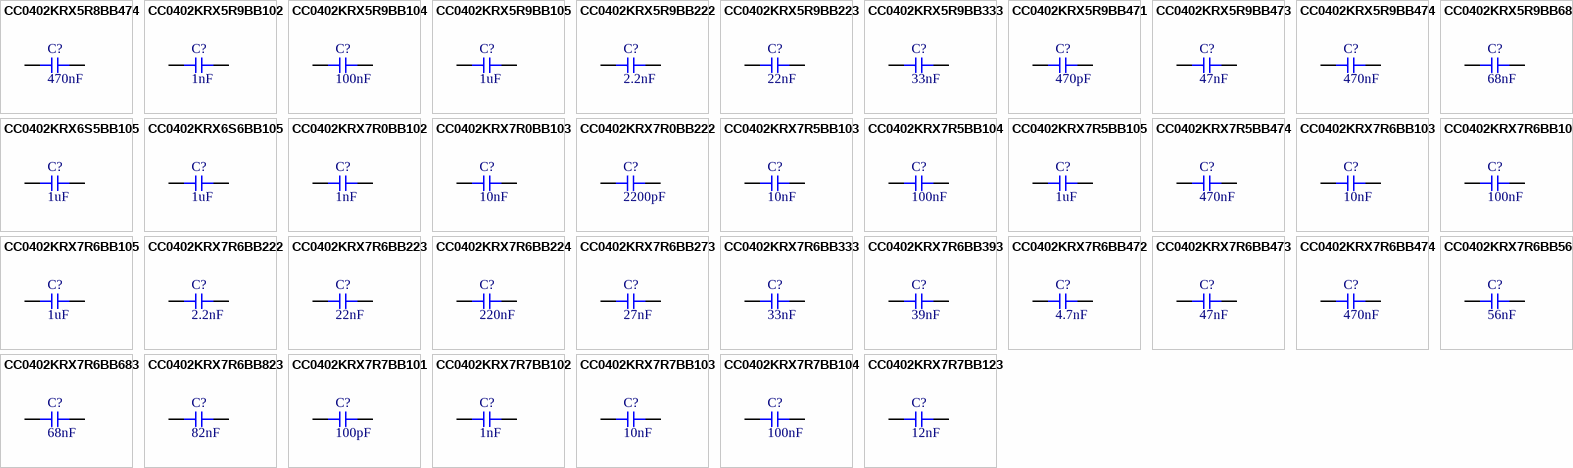
[diagram p38: symbols CC0402KRX5R8BB474 to CC0402KRX7R7BB123]

## CC0402KRX5R8BB474
designator C?  Capacitance: 470nF  (hidden comment: *)
Capacitor, Ceramic (MLCC), 470nF, ±10%, 25V, X5R, ±10%, SMD 0402; Manufacturer: YAGEO; Manufacturer Part Number: CC0402KRX5R8BB474; Package Size: 0402; JLCPCB Basic Part: No; JLCPCB Part Number: C541475; Supplier 1: LCSC; Category: Capacitors - MLCC; Supplier Part Number 1: C541475; Tolerance: ±10%; Voltage Rating: 25V; Temperature Coefficient: X5R; RoHS: Yes; ComponentLink1Description: Datasheet; ComponentLink1URL: https://wmsc.lcsc.com/wmsc/upload/file/pdf/v2/lcsc/2407081117_YAGEO-CC0402KRX5R8BB474_C541475.pdf; ComponentLink2Description: JLCPCB Part URL; ComponentLink2URL: https://jlcpcb.com/partdetail/C541475; ComponentLink3Description: LCSC Part URL; ComponentLink3URL: https://lcsc.com/product-detail/Multilayer-Ceramic-Capacitors-MLCC---SMD-SMT_YAGEO-YAGEO-CC0402KRX5R8BB474_C541475.html
footprint CAP-0402 (0402 (1005M) Capacitor)
pins: 1, 2

## CC0402KRX5R9BB102
designator C?  Capacitance: 1nF  (hidden comment: *)
Capacitor, Ceramic (MLCC), 1nF, ±10%, 50V, X5R, ±10%, SMD 0402; Manufacturer: YAGEO; Manufacturer Part Number: CC0402KRX5R9BB102; Package Size: 0402; JLCPCB Basic Part: No; JLCPCB Part Number: C576728; Supplier 1: LCSC; Category: Capacitors - MLCC; Supplier Part Number 1: C576728; Tolerance: ±10%; Voltage Rating: 50V; Temperature Coefficient: X5R; RoHS: Yes; ComponentLink1Description: Datasheet; ComponentLink1URL: https://wmsc.lcsc.com/wmsc/upload/file/pdf/v2/lcsc/2407081117_YAGEO-CC0402KRX5R9BB102_C576728.pdf; ComponentLink2Description: JLCPCB Part URL; ComponentLink2URL: https://jlcpcb.com/partdetail/C576728; ComponentLink3Description: LCSC Part URL; ComponentLink3URL: https://lcsc.com/product-detail/Multilayer-Ceramic-Capacitors-MLCC---SMD-SMT_YAGEO-YAGEO-CC0402KRX5R9BB102_C576728.html
footprint CAP-0402 (0402 (1005M) Capacitor)
pins: 1, 2

## CC0402KRX5R9BB104
designator C?  Capacitance: 100nF  (hidden comment: *)
Capacitor, Ceramic (MLCC), 100nF, ±10%, 50V, X5R, ±10%, SMD 0402; Manufacturer: YAGEO; Manufacturer Part Number: CC0402KRX5R9BB104; Package Size: 0402; JLCPCB Basic Part: No; JLCPCB Part Number: C105882; Supplier 1: LCSC; Category: Capacitors - MLCC; Supplier Part Number 1: C105882; Tolerance: ±10%; Voltage Rating: 50V; Temperature Coefficient: X5R; RoHS: Yes; ComponentLink1Description: Datasheet; ComponentLink1URL: https://wmsc.lcsc.com/wmsc/upload/file/pdf/v2/lcsc/2407081117_YAGEO-CC0402KRX5R9BB104_C105882.pdf; ComponentLink2Description: JLCPCB Part URL; ComponentLink2URL: https://jlcpcb.com/partdetail/C105882; ComponentLink3Description: LCSC Part URL; ComponentLink3URL: https://lcsc.com/product-detail/Multilayer-Ceramic-Capacitors-MLCC---SMD-SMT_YAGEO-YAGEO-CC0402KRX5R9BB104_C105882.html
footprint CAP-0402 (0402 (1005M) Capacitor)
pins: 1, 2

## CC0402KRX5R9BB105
designator C?  Capacitance: 1uF  (hidden comment: *)
Capacitor, Ceramic (MLCC), 1uF, ±10%, 50V, X5R, ±10%, SMD 0402; Manufacturer: YAGEO; Manufacturer Part Number: CC0402KRX5R9BB105; Package Size: 0402; JLCPCB Basic Part: No; JLCPCB Part Number: C7500380; Supplier 1: LCSC; Category: Capacitors - MLCC; Supplier Part Number 1: C7500380; Tolerance: ±10%; Voltage Rating: 50V; Temperature Coefficient: X5R; RoHS: Yes; ComponentLink1Description: Datasheet; ComponentLink1URL: https://wmsc.lcsc.com/wmsc/upload/file/pdf/v2/lcsc/2407081117_YAGEO-CC0402KRX5R9BB105_C7500380.pdf; ComponentLink2Description: JLCPCB Part URL; ComponentLink2URL: https://jlcpcb.com/partdetail/C7500380; ComponentLink3Description: LCSC Part URL; ComponentLink3URL: https://lcsc.com/product-detail/Multilayer-Ceramic-Capacitors-MLCC---SMD-SMT_YAGEO-YAGEO-CC0402KRX5R9BB105_C7500380.html
footprint CAP-0402 (0402 (1005M) Capacitor)
pins: 1, 2

## CC0402KRX5R9BB222
designator C?  Capacitance: 2.2nF  (hidden comment: *)
Capacitor, Ceramic (MLCC), 2.2nF, ±10%, 50V, X5R, ±10%, SMD 0402; Manufacturer: YAGEO; Manufacturer Part Number: CC0402KRX5R9BB222; Package Size: 0402; JLCPCB Basic Part: No; JLCPCB Part Number: C576729; Supplier 1: LCSC; Category: Capacitors - MLCC; Supplier Part Number 1: C576729; Tolerance: ±10%; Voltage Rating: 50V; Temperature Coefficient: X5R; RoHS: Yes; ComponentLink1Description: Datasheet; ComponentLink1URL: https://wmsc.lcsc.com/wmsc/upload/file/pdf/v2/lcsc/2407081117_YAGEO-CC0402KRX5R9BB222_C576729.pdf; ComponentLink2Description: JLCPCB Part URL; ComponentLink2URL: https://jlcpcb.com/partdetail/C576729; ComponentLink3Description: LCSC Part URL; ComponentLink3URL: https://lcsc.com/product-detail/Multilayer-Ceramic-Capacitors-MLCC---SMD-SMT_YAGEO-YAGEO-CC0402KRX5R9BB222_C576729.html
footprint CAP-0402 (0402 (1005M) Capacitor)
pins: 1, 2

## CC0402KRX5R9BB223
designator C?  Capacitance: 22nF  (hidden comment: *)
Capacitor, Ceramic (MLCC), 22nF, ±10%, 50V, X5R, ±10%, SMD 0402; Manufacturer: YAGEO; Manufacturer Part Number: CC0402KRX5R9BB223; Package Size: 0402; JLCPCB Basic Part: No; JLCPCB Part Number: C541400; Supplier 1: LCSC; Category: Capacitors - MLCC; Supplier Part Number 1: C541400; Tolerance: ±10%; Voltage Rating: 50V; Temperature Coefficient: X5R; RoHS: Yes; ComponentLink1Description: Datasheet; ComponentLink1URL: https://wmsc.lcsc.com/wmsc/upload/file/pdf/v2/lcsc/2407081117_YAGEO-CC0402KRX5R9BB223_C541400.pdf; ComponentLink2Description: JLCPCB Part URL; ComponentLink2URL: https://jlcpcb.com/partdetail/C541400; ComponentLink3Description: LCSC Part URL; ComponentLink3URL: https://lcsc.com/product-detail/Multilayer-Ceramic-Capacitors-MLCC---SMD-SMT_YAGEO-YAGEO-CC0402KRX5R9BB223_C541400.html
footprint CAP-0402 (0402 (1005M) Capacitor)
pins: 1, 2

## CC0402KRX5R9BB333
designator C?  Capacitance: 33nF  (hidden comment: *)
Capacitor, Ceramic (MLCC), 33nF, ±10%, 50V, X5R, ±10%, SMD 0402; Manufacturer: YAGEO; Manufacturer Part Number: CC0402KRX5R9BB333; Package Size: 0402; JLCPCB Basic Part: No; JLCPCB Part Number: C541401; Supplier 1: LCSC; Category: Capacitors - MLCC; Supplier Part Number 1: C541401; Tolerance: ±10%; Voltage Rating: 50V; Temperature Coefficient: X5R; RoHS: Yes; ComponentLink1Description: Datasheet; ComponentLink1URL: https://wmsc.lcsc.com/wmsc/upload/file/pdf/v2/lcsc/2407081117_YAGEO-CC0402KRX5R9BB333_C541401.pdf; ComponentLink2Description: JLCPCB Part URL; ComponentLink2URL: https://jlcpcb.com/partdetail/C541401; ComponentLink3Description: LCSC Part URL; ComponentLink3URL: https://lcsc.com/product-detail/Multilayer-Ceramic-Capacitors-MLCC---SMD-SMT_YAGEO-YAGEO-CC0402KRX5R9BB333_C541401.html
footprint CAP-0402 (0402 (1005M) Capacitor)
pins: 1, 2

## CC0402KRX5R9BB471
designator C?  Capacitance: 470pF  (hidden comment: *)
Capacitor, Ceramic (MLCC), 470pF, ±10%, 50V, X5R, ±10%, SMD 0402; Manufacturer: YAGEO; Manufacturer Part Number: CC0402KRX5R9BB471; Package Size: 0402; JLCPCB Basic Part: No; JLCPCB Part Number: C1853368; Supplier 1: LCSC; Category: Capacitors - MLCC; Supplier Part Number 1: C1853368; Tolerance: ±10%; Voltage Rating: 50V; Temperature Coefficient: X5R; RoHS: Yes; ComponentLink1Description: Datasheet; ComponentLink1URL: https://wmsc.lcsc.com/wmsc/upload/file/pdf/v2/lcsc/2407081117_YAGEO-CC0402KRX5R9BB471_C1853368.pdf; ComponentLink2Description: JLCPCB Part URL; ComponentLink2URL: https://jlcpcb.com/partdetail/C1853368; ComponentLink3Description: LCSC Part URL; ComponentLink3URL: https://lcsc.com/product-detail/Multilayer-Ceramic-Capacitors-MLCC---SMD-SMT_YAGEO-YAGEO-CC0402KRX5R9BB471_C1853368.html
footprint CAP-0402 (0402 (1005M) Capacitor)
pins: 1, 2

## CC0402KRX5R9BB473
designator C?  Capacitance: 47nF  (hidden comment: *)
Capacitor, Ceramic (MLCC), 47nF, ±10%, 50V, X5R, ±10%, SMD 0402; Manufacturer: YAGEO; Manufacturer Part Number: CC0402KRX5R9BB473; Package Size: 0402; JLCPCB Basic Part: No; JLCPCB Part Number: C505502; Supplier 1: LCSC; Category: Capacitors - MLCC; Supplier Part Number 1: C505502; Tolerance: ±10%; Voltage Rating: 50V; Temperature Coefficient: X5R; RoHS: Yes; ComponentLink1Description: Datasheet; ComponentLink1URL: https://wmsc.lcsc.com/wmsc/upload/file/pdf/v2/lcsc/2407081117_YAGEO-CC0402KRX5R9BB473_C505502.pdf; ComponentLink2Description: JLCPCB Part URL; ComponentLink2URL: https://jlcpcb.com/partdetail/C505502; ComponentLink3Description: LCSC Part URL; ComponentLink3URL: https://lcsc.com/product-detail/Multilayer-Ceramic-Capacitors-MLCC---SMD-SMT_YAGEO-YAGEO-CC0402KRX5R9BB473_C505502.html
footprint CAP-0402 (0402 (1005M) Capacitor)
pins: 1, 2

## CC0402KRX5R9BB474
designator C?  Capacitance: 470nF  (hidden comment: *)
Capacitor, Ceramic (MLCC), 470nF, ±10%, 50V, X5R, ±10%, SMD 0402; Manufacturer: YAGEO; Manufacturer Part Number: CC0402KRX5R9BB474; Package Size: 0402; JLCPCB Basic Part: No; JLCPCB Part Number: C513552; Supplier 1: LCSC; Category: Capacitors - MLCC; Supplier Part Number 1: C513552; Tolerance: ±10%; Voltage Rating: 50V; Temperature Coefficient: X5R; RoHS: Yes; ComponentLink1Description: Datasheet; ComponentLink1URL: https://wmsc.lcsc.com/wmsc/upload/file/pdf/v2/lcsc/2407081117_YAGEO-CC0402KRX5R9BB474_C513552.pdf; ComponentLink2Description: JLCPCB Part URL; ComponentLink2URL: https://jlcpcb.com/partdetail/C513552; ComponentLink3Description: LCSC Part URL; ComponentLink3URL: https://lcsc.com/product-detail/Multilayer-Ceramic-Capacitors-MLCC---SMD-SMT_YAGEO-YAGEO-CC0402KRX5R9BB474_C513552.html
footprint CAP-0402 (0402 (1005M) Capacitor)
pins: 1, 2

## CC0402KRX5R9BB683
designator C?  Capacitance: 68nF  (hidden comment: *)
Capacitor, Ceramic (MLCC), 68nF, ±10%, 50V, X5R, ±10%, SMD 0402; Manufacturer: YAGEO; Manufacturer Part Number: CC0402KRX5R9BB683; Package Size: 0402; JLCPCB Basic Part: No; JLCPCB Part Number: C541402; Supplier 1: LCSC; Category: Capacitors - MLCC; Supplier Part Number 1: C541402; Tolerance: ±10%; Voltage Rating: 50V; Temperature Coefficient: X5R; RoHS: Yes; ComponentLink1Description: Datasheet; ComponentLink1URL: https://wmsc.lcsc.com/wmsc/upload/file/pdf/v2/lcsc/2407081117_YAGEO-CC0402KRX5R9BB683_C541402.pdf; ComponentLink2Description: JLCPCB Part URL; ComponentLink2URL: https://jlcpcb.com/partdetail/C541402; ComponentLink3Description: LCSC Part URL; ComponentLink3URL: https://lcsc.com/product-detail/Multilayer-Ceramic-Capacitors-MLCC---SMD-SMT_YAGEO-YAGEO-CC0402KRX5R9BB683_C541402.html
footprint CAP-0402 (0402 (1005M) Capacitor)
pins: 1, 2

## CC0402KRX6S5BB105
designator C?  Capacitance: 1uF  (hidden comment: *)
Capacitor, Ceramic (MLCC), 1uF, ±10%, 6.3V, X6S, ±10%, SMD 0402; Manufacturer: YAGEO; Manufacturer Part Number: CC0402KRX6S5BB105; Package Size: 0402; JLCPCB Basic Part: No; JLCPCB Part Number: C527012; Supplier 1: LCSC; Category: Capacitors - MLCC; Supplier Part Number 1: C527012; Tolerance: ±10%; Voltage Rating: 6.3V; Temperature Coefficient: X6S; RoHS: Yes; ComponentLink1Description: Datasheet; ComponentLink1URL: https://wmsc.lcsc.com/wmsc/upload/file/pdf/v2/lcsc/2009180903_YAGEO-CC0402KRX6S5BB105_C527012.pdf; ComponentLink2Description: JLCPCB Part URL; ComponentLink2URL: https://jlcpcb.com/partdetail/C527012; ComponentLink3Description: LCSC Part URL; ComponentLink3URL: https://lcsc.com/product-detail/Multilayer-Ceramic-Capacitors-MLCC---SMD-SMT_YAGEO-YAGEO-CC0402KRX6S5BB105_C527012.html
footprint CAP-0402 (0402 (1005M) Capacitor)
pins: 1, 2

## CC0402KRX6S6BB105
designator C?  Capacitance: 1uF  (hidden comment: *)
Capacitor, Ceramic (MLCC), 1uF, ±10%, 10V, X6S, ±10%, SMD 0402; Manufacturer: YAGEO; Manufacturer Part Number: CC0402KRX6S6BB105; Package Size: 0402; JLCPCB Basic Part: No; JLCPCB Part Number: C541411; Supplier 1: LCSC; Category: Capacitors - MLCC; Supplier Part Number 1: C541411; Tolerance: ±10%; Voltage Rating: 10V; Temperature Coefficient: X6S; RoHS: Yes; ComponentLink1Description: Datasheet; ComponentLink1URL: https://wmsc.lcsc.com/wmsc/upload/file/pdf/v2/lcsc/2006151134_YAGEO-CC0402KRX6S6BB105_C541411.pdf; ComponentLink2Description: JLCPCB Part URL; ComponentLink2URL: https://jlcpcb.com/partdetail/C541411; ComponentLink3Description: LCSC Part URL; ComponentLink3URL: https://lcsc.com/product-detail/Multilayer-Ceramic-Capacitors-MLCC---SMD-SMT_YAGEO-YAGEO-CC0402KRX6S6BB105_C541411.html
footprint CAP-0402 (0402 (1005M) Capacitor)
pins: 1, 2

## CC0402KRX7R0BB102
designator C?  Capacitance: 1nF  (hidden comment: *)
Capacitor, Ceramic (MLCC), 1nF, ±10%, 100V, X7R, ±10%, SMD 0402; Manufacturer: YAGEO; Manufacturer Part Number: CC0402KRX7R0BB102; Package Size: 0402; JLCPCB Basic Part: No; JLCPCB Part Number: C527013; Supplier 1: LCSC; Category: Capacitors - MLCC; Supplier Part Number 1: C527013; Tolerance: ±10%; Voltage Rating: 100V; Temperature Coefficient: X7R; RoHS: Yes; ComponentLink1Description: Datasheet; ComponentLink1URL: https://wmsc.lcsc.com/wmsc/upload/file/pdf/v2/lcsc/2005222139_YAGEO-CC0402KRX7R0BB102_C527013.pdf; ComponentLink2Description: JLCPCB Part URL; ComponentLink2URL: https://jlcpcb.com/partdetail/C527013; ComponentLink3Description: LCSC Part URL; ComponentLink3URL: https://lcsc.com/product-detail/Multilayer-Ceramic-Capacitors-MLCC---SMD-SMT_YAGEO-YAGEO-CC0402KRX7R0BB102_C527013.html
footprint CAP-0402 (0402 (1005M) Capacitor)
pins: 1, 2

## CC0402KRX7R0BB103
designator C?  Capacitance: 10nF  (hidden comment: *)
Capacitor, Ceramic (MLCC), 10nF, ±10%, 100V, X7R, ±10%, SMD 0402; Manufacturer: YAGEO; Manufacturer Part Number: CC0402KRX7R0BB103; Package Size: 0402; JLCPCB Basic Part: No; JLCPCB Part Number: C527014; Supplier 1: LCSC; Category: Capacitors - MLCC; Supplier Part Number 1: C527014; Tolerance: ±10%; Voltage Rating: 100V; Temperature Coefficient: X7R; RoHS: Yes; ComponentLink1Description: Datasheet; ComponentLink1URL: https://wmsc.lcsc.com/wmsc/upload/file/pdf/v2/lcsc/2007171235_YAGEO-CC0402KRX7R0BB103_C527014.pdf; ComponentLink2Description: JLCPCB Part URL; ComponentLink2URL: https://jlcpcb.com/partdetail/C527014; ComponentLink3Description: LCSC Part URL; ComponentLink3URL: https://lcsc.com/product-detail/Multilayer-Ceramic-Capacitors-MLCC---SMD-SMT_YAGEO-YAGEO-CC0402KRX7R0BB103_C527014.html
footprint CAP-0402 (0402 (1005M) Capacitor)
pins: 1, 2

## CC0402KRX7R0BB222
designator C?  Capacitance: 2200pF  (hidden comment: *)
Capacitor, Ceramic (MLCC), 2200pF, ±10%, 100V, ±10%, SMD 0402; Manufacturer: YAGEO; Manufacturer Part Number: CC0402KRX7R0BB222; Package Size: 0402; JLCPCB Basic Part: No; JLCPCB Part Number: C576731; Supplier 1: LCSC; Category: Capacitors - MLCC; Supplier Part Number 1: C576731; Tolerance: ±10%; Voltage Rating: 100V; RoHS: Yes; ComponentLink1Description: Datasheet; ComponentLink1URL: https://wmsc.lcsc.com/wmsc/upload/file/pdf/v2/lcsc/2211211800_YAGEO-CC0402KRX7R0BB222_C576731.pdf; ComponentLink2Description: JLCPCB Part URL; ComponentLink2URL: https://jlcpcb.com/partdetail/C576731; ComponentLink3Description: LCSC Part URL; ComponentLink3URL: https://lcsc.com/product-detail/Multilayer-Ceramic-Capacitors-MLCC---SMD-SMT_YAGEO-YAGEO-CC0402KRX7R0BB222_C576731.html
footprint CAP-0402 (0402 (1005M) Capacitor)
pins: 1, 2

## CC0402KRX7R5BB103
designator C?  Capacitance: 10nF  (hidden comment: *)
Capacitor, Ceramic (MLCC), 10nF, ±10%, 6.3V, X7R, ±10%, SMD 0402; Manufacturer: YAGEO; Manufacturer Part Number: CC0402KRX7R5BB103; Package Size: 0402; JLCPCB Basic Part: No; JLCPCB Part Number: C541370; Supplier 1: LCSC; Category: Capacitors - MLCC; Supplier Part Number 1: C541370; Tolerance: ±10%; Voltage Rating: 6.3V; Temperature Coefficient: X7R; RoHS: Yes; ComponentLink1Description: Datasheet; ComponentLink1URL: https://wmsc.lcsc.com/wmsc/upload/file/pdf/v2/lcsc/2006151112_YAGEO-CC0402KRX7R5BB103_C541370.pdf; ComponentLink2Description: JLCPCB Part URL; ComponentLink2URL: https://jlcpcb.com/partdetail/C541370; ComponentLink3Description: LCSC Part URL; ComponentLink3URL: https://lcsc.com/product-detail/Multilayer-Ceramic-Capacitors-MLCC---SMD-SMT_YAGEO-YAGEO-CC0402KRX7R5BB103_C541370.html
footprint CAP-0402 (0402 (1005M) Capacitor)
pins: 1, 2
